# Altium footprint library PowerProducts.PCBLIB: 166 footprints (part 6 of 11)
Each footprint in its own frame and in the unit in brackets; x right, y up, seen from the top. Pads: shape width x height; smd on the part's side, far side on the other; paste and mask are expansions set on the pad; w line width, h text height; cw(c..) or ccw(c..) is an arc to the next point about the centre after c.
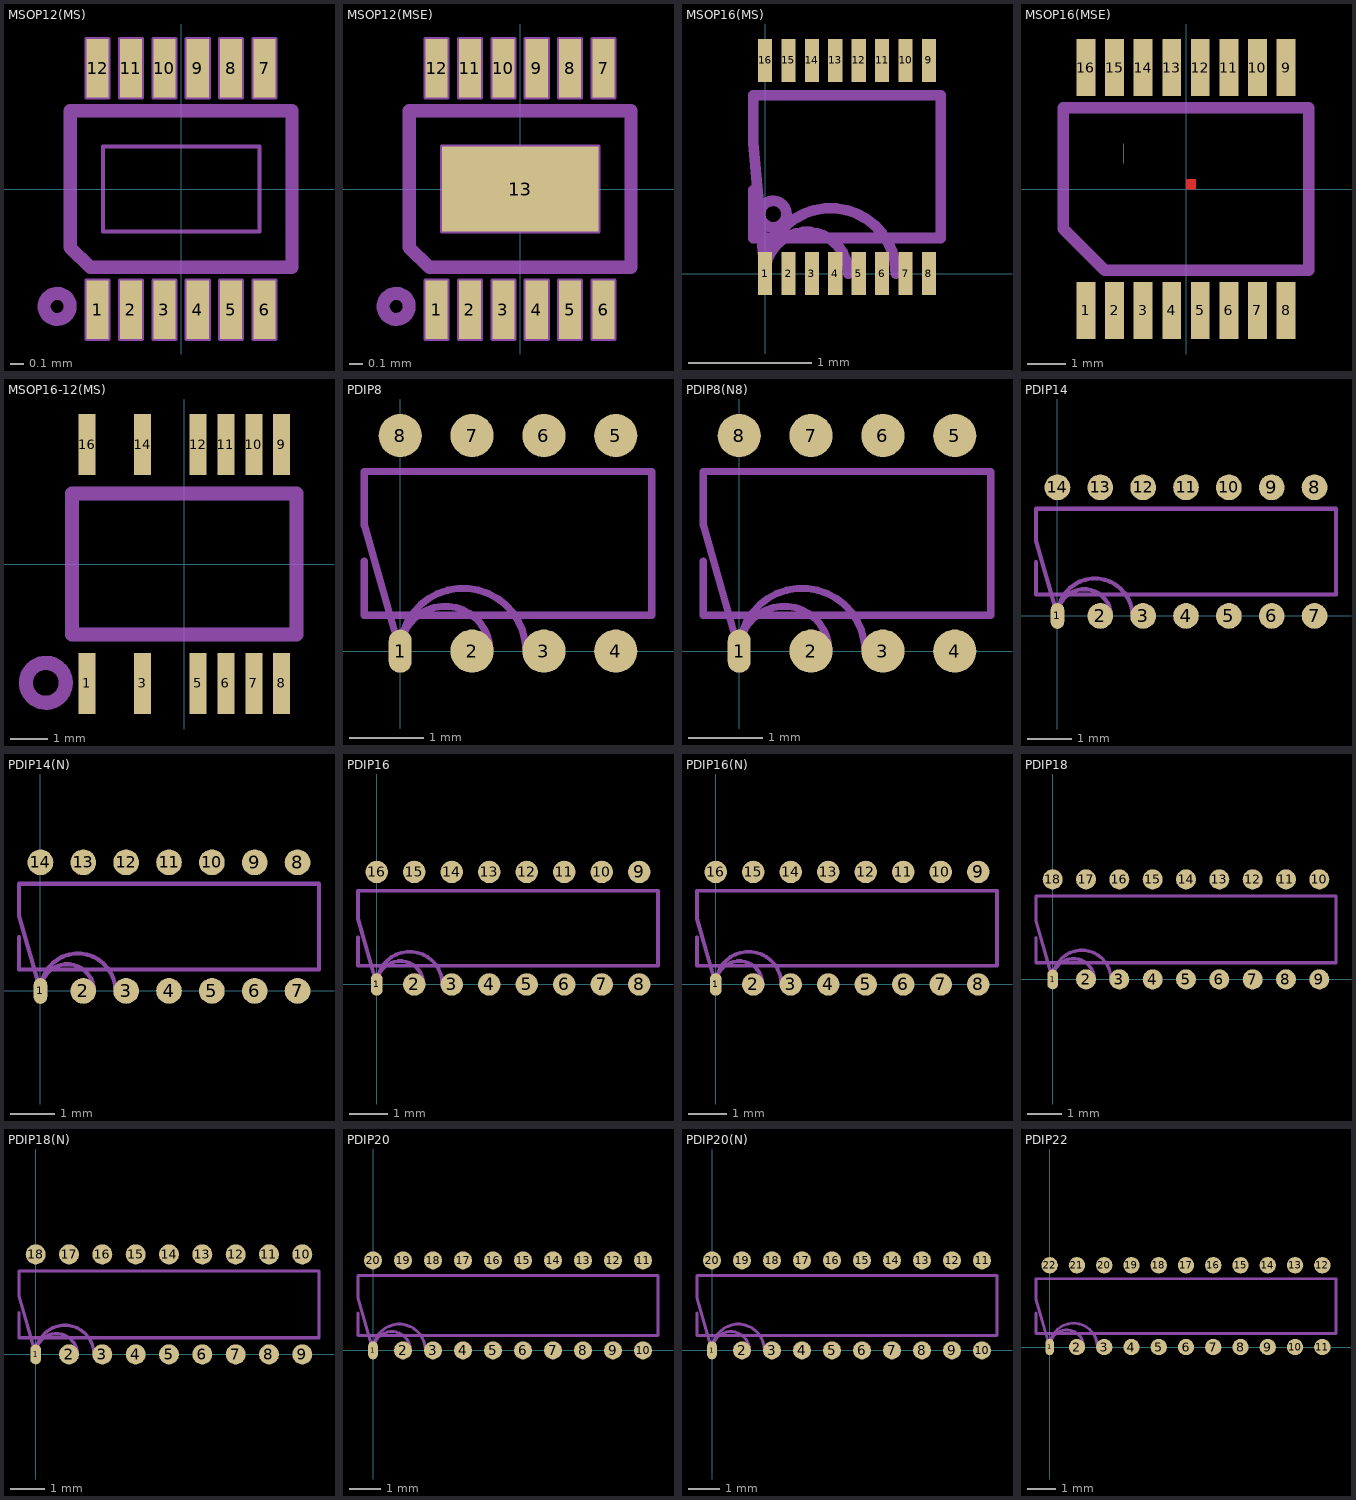
[diagram p5: the footprints below, top view; thin cyan lines are the x and y axes]

## MSOP12(MS) [mil]
pads (12):
  rect 6.48x17.15 smd: 1(-24.38,-35.24) 2(-14.63,-35.24) 3(-4.88,-35.24) 4(4.88,-35.24) 5(14.63,-35.24) 6(24.38,-35.24) 7(24.38,35.24) 8(14.63,35.24) 9(4.88,35.24) 10(-4.88,35.24) 11(-14.63,35.24) 12(-24.38,35.24)
Mechanical 2:
  circle w3.81: c-36.2,-34.29 r3.81
  lines w1.14: -27.61,-43.82 -27.61,-26.67 -21.14,-26.67 -21.14,-43.82 -27.61,-43.82 ; -27.61,26.67 -27.61,43.82 -21.14,43.82 -21.14,26.67 -27.61,26.67 ; -22.86,-12.38 22.86,-12.38 22.86,12.38 -22.86,12.38 -22.86,-12.38 ; -17.87,-43.82 -17.87,-26.67 -11.39,-26.67 -11.39,-43.82 -17.87,-43.82 ; -17.87,26.67 -17.87,43.82 -11.39,43.82 -11.39,26.67 -17.87,26.67 ; -8.12,-43.82 -8.12,-26.67 -1.64,-26.67 -1.64,-43.82 -8.12,-43.82 ; -8.12,26.67 -8.12,43.82 -1.64,43.82 -1.64,26.67 -8.12,26.67 ; 1.64,-43.82 1.64,-26.67 8.12,-26.67 8.12,-43.82 1.64,-43.82 ; 1.64,26.67 1.64,43.82 8.12,43.82 8.12,26.67 1.64,26.67 ; 11.39,-43.82 11.39,-26.67 17.87,-26.67 17.87,-43.82 11.39,-43.82 ; 11.39,26.67 11.39,43.82 17.87,43.82 17.87,26.67 11.39,26.67 ; 21.14,-43.82 21.14,-26.67 27.61,-26.67 27.61,-43.82 21.14,-43.82 ; 21.14,26.67 21.14,43.82 27.61,43.82 27.61,26.67 21.14,26.67
  lines w3.81: -32.38,22.86 -32.38,-17.15 -26.51,-22.86 32.38,-22.86 32.38,22.86 -32.23,22.86

## MSOP12(MSE) [mil]
pads (13):
  rect 6.48x17.15 smd: 1(-24.38,-35.24) 2(-14.63,-35.24) 3(-4.88,-35.24) 4(4.88,-35.24) 5(14.63,-35.24) 6(24.38,-35.24) 7(24.38,35.24) 8(14.63,35.24) 9(4.88,35.24) 10(-4.88,35.24) 11(-14.63,35.24) 12(-24.38,35.24)
  rect 45.72x24.77 smd: 13(0,0)
Mechanical 2:
  circle w3.81: c-36.2,-34.29 r3.81
  lines w1.14: -27.61,-43.82 -27.61,-26.67 -21.14,-26.67 -21.14,-43.82 -27.61,-43.82 ; -27.61,26.67 -27.61,43.82 -21.14,43.82 -21.14,26.67 -27.61,26.67 ; -22.86,-12.38 22.86,-12.38 22.86,12.38 -22.86,12.38 -22.86,-12.38 ; -17.87,-43.82 -17.87,-26.67 -11.39,-26.67 -11.39,-43.82 -17.87,-43.82 ; -17.87,26.67 -17.87,43.82 -11.39,43.82 -11.39,26.67 -17.87,26.67 ; -8.12,-43.82 -8.12,-26.67 -1.64,-26.67 -1.64,-43.82 -8.12,-43.82 ; -8.12,26.67 -8.12,43.82 -1.64,43.82 -1.64,26.67 -8.12,26.67 ; 1.64,-43.82 1.64,-26.67 8.12,-26.67 8.12,-43.82 1.64,-43.82 ; 1.64,26.67 1.64,43.82 8.12,43.82 8.12,26.67 1.64,26.67 ; 11.39,-43.82 11.39,-26.67 17.87,-26.67 17.87,-43.82 11.39,-43.82 ; 11.39,26.67 11.39,43.82 17.87,43.82 17.87,26.67 11.39,26.67 ; 21.14,-43.82 21.14,-26.67 27.61,-26.67 27.61,-43.82 21.14,-43.82 ; 21.14,26.67 21.14,43.82 27.61,43.82 27.61,26.67 21.14,26.67
  lines w3.81: -32.38,22.86 -32.38,-17.15 -26.51,-22.86 32.38,-22.86 32.38,22.86 -32.23,22.86

## MSOP16(MS) [mil]
pads (16):
  rect 4.57x13.72 smd: 1(0,0) 2(7.51,0) 3(15.01,0) 4(22.52,0) 5(30.02,0) 6(37.49,0) 7(44.99,0) 8(52.49,0) 9(52.49,68.28) 10(44.99,68.28) 11(37.49,68.28) 12(29.99,68.28) 13(22.49,68.28) 14(15,68.28) 15(7.5,68.28) 16(0,68.28)
Mechanical 2:
  circle w3.43: c2.63,19.05 r4.26
  lines w3.43: -3.75,26.67 -3.75,11.43 56.24,11.43 56.24,57.15 -3.75,57.15 -3.75,41.91 0,0 ; 26.67,0 ccw(c13.34,0) 0,0 ; 41.91,0 ccw(c20.95,0) 0,0

## MSOP16(MSE) [mm]
pads (17):
  rect 0.495x1.5 smd: 1(-2.625,-3.187) 2(-1.875,-3.187) 3(-1.125,-3.187) 4(-0.375,-3.187) 5(0.375,-3.187) 6(1.125,-3.187) 7(1.875,-3.187) 8(2.625,-3.187) 9(2.625,3.187) 10(1.875,3.187) 11(1.125,3.187) 12(0.375,3.187) 13(-0.375,3.187) 14(-1.125,3.187) 15(-1.875,3.187) 16(-2.625,3.187)
  rect 0x0.525 smd: 17(-1.635,0.93)
Top Layer:
  region: 0,0 0.254,0 0.254,0.254 0,0.254
  region: 0,0 0.254,0 0.254,0.254 0,0.254
  region: 0,0 0.254,0 0.254,0.254 0,0.254
Top Paste:
  region: 0,0 0.254,0 0.254,0.254 0,0.254
  region: 0,0 0.254,0 0.254,0.254 0,0.254
  region: 0,0 0.254,0 0.254,0.254 0,0.254
Top Solder:
  region: 0,0 0.254,0 0.254,0.254 0,0.254
  region: 0,0 0.254,0 0.254,0.254 0,0.254
  region: 0,0 0.254,0 0.254,0.254 0,0.254
Mechanical 2:
  lines w0.305: -3.225,-1.042 -2.13,-2.137 3.225,-2.137 3.225,2.137 -3.225,2.137 -3.225,-1.042

## MSOP16-12(MS) [mm]
pads (12):
  rect 0.457x1.65 smd: 1(-2.625,-3.225) 3(-1.125,-3.225) 5(0.375,-3.225) 6(1.125,-3.225) 7(1.875,-3.225) 8(2.625,-3.225) 9(2.625,3.225) 10(1.875,3.225) 11(1.125,3.225) 12(0.375,3.225) 14(-1.125,3.225) 16(-2.625,3.225)
Mechanical 2:
  circle w0.381: c-3.739,-3.208 r0.539
  circle w0.381: c-3.739,-3.208 r0.539
  lines w0.381: -3.029,-1.905 3.029,-1.905 3.029,1.905 -3.029,1.905 -3.029,-1.905

## PDIP8 [mil]
pads (8):
  rrect100% 12.19x22.86 smd: 1(0,0)
  rrect100% 22.86x22.86 smd: 2(38.1,0) 3(76.2,0) 4(114.3,0) 5(114.3,114.3) 6(76.2,114.3) 7(38.1,114.3) 8(0,114.3)
Mechanical 2:
  lines w3.81: -19.05,47.63 -19.05,19.05 133.35,19.05 133.35,95.25 -19.05,95.25 -19.05,66.68 0,0 ; 47.63,0 ccw(c23.82,0) 0,0 ; 66.68,0 ccw(c33.34,0) 0,0

## PDIP8(N8) [mil]
pads (8):
  rrect100% 12.19x22.86 smd: 1(0,0)
  rrect100% 22.86x22.86 smd: 2(38.1,0) 3(76.2,0) 4(114.3,0) 5(114.3,114.3) 6(76.2,114.3) 7(38.1,114.3) 8(0,114.3)
Mechanical 2:
  lines w3.81: -19.05,47.63 -19.05,19.05 133.35,19.05 133.35,95.25 -19.05,95.25 -19.05,66.68 0,0 ; 47.63,0 ccw(c23.82,0) 0,0 ; 66.68,0 ccw(c33.34,0) 0,0

## PDIP14 [mil]
pads (14):
  rrect100% 12.19x22.86 smd: 1(0,0)
  rrect100% 22.86x22.86 smd: 2(38.1,0) 3(76.2,0) 4(114.3,0) 5(152.4,0) 6(190.5,0) 7(228.6,0) 8(228.6,114.3) 9(190.5,114.3) 10(152.4,114.3) 11(114.3,114.3) 12(76.2,114.3) 13(38.1,114.3) 14(0,114.3)
Mechanical 2:
  lines w3.81: -19.05,47.63 -19.05,19.05 247.65,19.05 247.65,95.25 -19.05,95.25 -19.05,66.68 0,0 ; 47.63,0 ccw(c23.82,0) 0,0 ; 66.68,0 ccw(c33.34,0) 0,0

## PDIP14(N) [mil]
pads (14):
  rrect100% 12.19x22.86 smd: 1(0,0)
  rrect100% 22.86x22.86 smd: 2(38.1,0) 3(76.2,0) 4(114.3,0) 5(152.4,0) 6(190.5,0) 7(228.6,0) 8(228.6,114.3) 9(190.5,114.3) 10(152.4,114.3) 11(114.3,114.3) 12(76.2,114.3) 13(38.1,114.3) 14(0,114.3)
Mechanical 2:
  lines w3.81: -19.05,47.63 -19.05,19.05 247.65,19.05 247.65,95.25 -19.05,95.25 -19.05,66.68 0,0 ; 47.63,0 ccw(c23.82,0) 0,0 ; 66.68,0 ccw(c33.34,0) 0,0

## PDIP16 [mil]
pads (16):
  rrect100% 12.19x22.86 smd: 1(0,0)
  rrect100% 22.86x22.86 smd: 2(38.1,0) 3(76.2,0) 4(114.3,0) 5(152.4,0) 6(190.5,0) 7(228.6,0) 8(266.7,0) 9(266.7,114.3) 10(228.6,114.3) 11(190.5,114.3) 12(152.4,114.3) 13(114.3,114.3) 14(76.2,114.3) 15(38.1,114.3) 16(0,114.3)
Mechanical 2:
  lines w3.81: -19.05,47.63 -19.05,19.05 285.75,19.05 285.75,95.25 -19.05,95.25 -19.05,66.68 0,0 ; 47.63,0 ccw(c23.82,0) 0,0 ; 66.68,0 ccw(c33.34,0) 0,0

## PDIP16(N) [mil]
pads (16):
  rrect100% 12.19x22.86 smd: 1(0,0)
  rrect100% 22.86x22.86 smd: 2(38.1,0) 3(76.2,0) 4(114.3,0) 5(152.4,0) 6(190.5,0) 7(228.6,0) 8(266.7,0) 9(266.7,114.3) 10(228.6,114.3) 11(190.5,114.3) 12(152.4,114.3) 13(114.3,114.3) 14(76.2,114.3) 15(38.1,114.3) 16(0,114.3)
Mechanical 2:
  lines w3.81: -19.05,47.63 -19.05,19.05 285.75,19.05 285.75,95.25 -19.05,95.25 -19.05,66.68 0,0 ; 47.63,0 ccw(c23.82,0) 0,0 ; 66.68,0 ccw(c33.34,0) 0,0

## PDIP18 [mil]
pads (18):
  rrect100% 12.19x22.86 smd: 1(0,0)
  rrect100% 22.86x22.86 smd: 2(38.1,0) 3(76.2,0) 4(114.3,0) 5(152.4,0) 6(190.5,0) 7(228.6,0) 8(266.7,0) 9(304.8,0) 10(304.8,114.3) 11(266.7,114.3) 12(228.6,114.3) 13(190.5,114.3) 14(152.4,114.3) 15(114.3,114.3) 16(76.2,114.3) 17(38.1,114.3) 18(0,114.3)
Mechanical 2:
  lines w3.81: -19.05,47.63 -19.05,19.05 323.85,19.05 323.85,95.25 -19.05,95.25 -19.05,66.68 0,0 ; 47.63,0 ccw(c23.82,0) 0,0 ; 66.68,0 ccw(c33.34,0) 0,0

## PDIP18(N) [mil]
pads (18):
  rrect100% 12.19x22.86 smd: 1(0,0)
  rrect100% 22.86x22.86 smd: 2(38.1,0) 3(76.2,0) 4(114.3,0) 5(152.4,0) 6(190.5,0) 7(228.6,0) 8(266.7,0) 9(304.8,0) 10(304.8,114.3) 11(266.7,114.3) 12(228.6,114.3) 13(190.5,114.3) 14(152.4,114.3) 15(114.3,114.3) 16(76.2,114.3) 17(38.1,114.3) 18(0,114.3)
Mechanical 2:
  lines w3.81: -19.05,47.63 -19.05,19.05 323.85,19.05 323.85,95.25 -19.05,95.25 -19.05,66.68 0,0 ; 47.63,0 ccw(c23.82,0) 0,0 ; 66.68,0 ccw(c33.34,0) 0,0

## PDIP20 [mil]
pads (20):
  rrect100% 12.19x22.86 smd: 1(0,0)
  rrect100% 22.86x22.86 smd: 2(38.1,0) 3(76.2,0) 4(114.3,0) 5(152.4,0) 6(190.5,0) 7(228.6,0) 8(266.7,0) 9(304.8,0) 10(342.9,0) 11(342.9,114.3) 12(304.8,114.3) 13(266.7,114.3) 14(228.6,114.3) 15(190.5,114.3) 16(152.4,114.3) 17(114.3,114.3) 18(76.2,114.3) 19(38.1,114.3) 20(0,114.3)
Mechanical 2:
  lines w3.81: -19.05,47.63 -19.05,19.05 361.95,19.05 361.95,95.25 -19.05,95.25 -19.05,66.68 0,0 ; 47.63,0 ccw(c23.82,0) 0,0 ; 66.68,0 ccw(c33.34,0) 0,0

## PDIP20(N) [mil]
pads (20):
  rrect100% 12.19x22.86 smd: 1(0,0)
  rrect100% 22.86x22.86 smd: 2(38.1,0) 3(76.2,0) 4(114.3,0) 5(152.4,0) 6(190.5,0) 7(228.6,0) 8(266.7,0) 9(304.8,0) 10(342.9,0) 11(342.9,114.3) 12(304.8,114.3) 13(266.7,114.3) 14(228.6,114.3) 15(190.5,114.3) 16(152.4,114.3) 17(114.3,114.3) 18(76.2,114.3) 19(38.1,114.3) 20(0,114.3)
Mechanical 2:
  lines w3.81: -19.05,47.63 -19.05,19.05 361.95,19.05 361.95,95.25 -19.05,95.25 -19.05,66.68 0,0 ; 47.63,0 ccw(c23.82,0) 0,0 ; 66.68,0 ccw(c33.34,0) 0,0

## PDIP22 [mil]
pads (22):
  rrect100% 12.19x22.86 smd: 1(0,0)
  rrect100% 22.86x22.86 smd: 2(38.1,0) 3(76.2,0) 4(114.3,0) 5(152.4,0) 6(190.5,0) 7(228.6,0) 8(266.7,0) 9(304.8,0) 10(342.9,0) 11(381,0) 12(381,114.3) 13(342.9,114.3) 14(304.8,114.3) 15(266.7,114.3) 16(228.6,114.3) 17(190.5,114.3) 18(152.4,114.3) 19(114.3,114.3) 20(76.2,114.3) 21(38.1,114.3) 22(0,114.3)
Mechanical 2:
  lines w3.81: -19.05,47.63 -19.05,19.05 400.05,19.05 400.05,95.25 -19.05,95.25 -19.05,66.68 0,0 ; 47.63,0 ccw(c23.82,0) 0,0 ; 66.68,0 ccw(c33.34,0) 0,0